# Altium footprint library GND_Studio.PcbLib: 16 footprints
Each footprint in its own frame and in the unit in brackets; x right, y up, seen from the top. Pads: shape width x height; smd on the part's side, far side on the other; paste and mask are expansions set on the pad; w line width, h text height; cw(c..) or ccw(c..) is an arc to the next point about the centre after c.
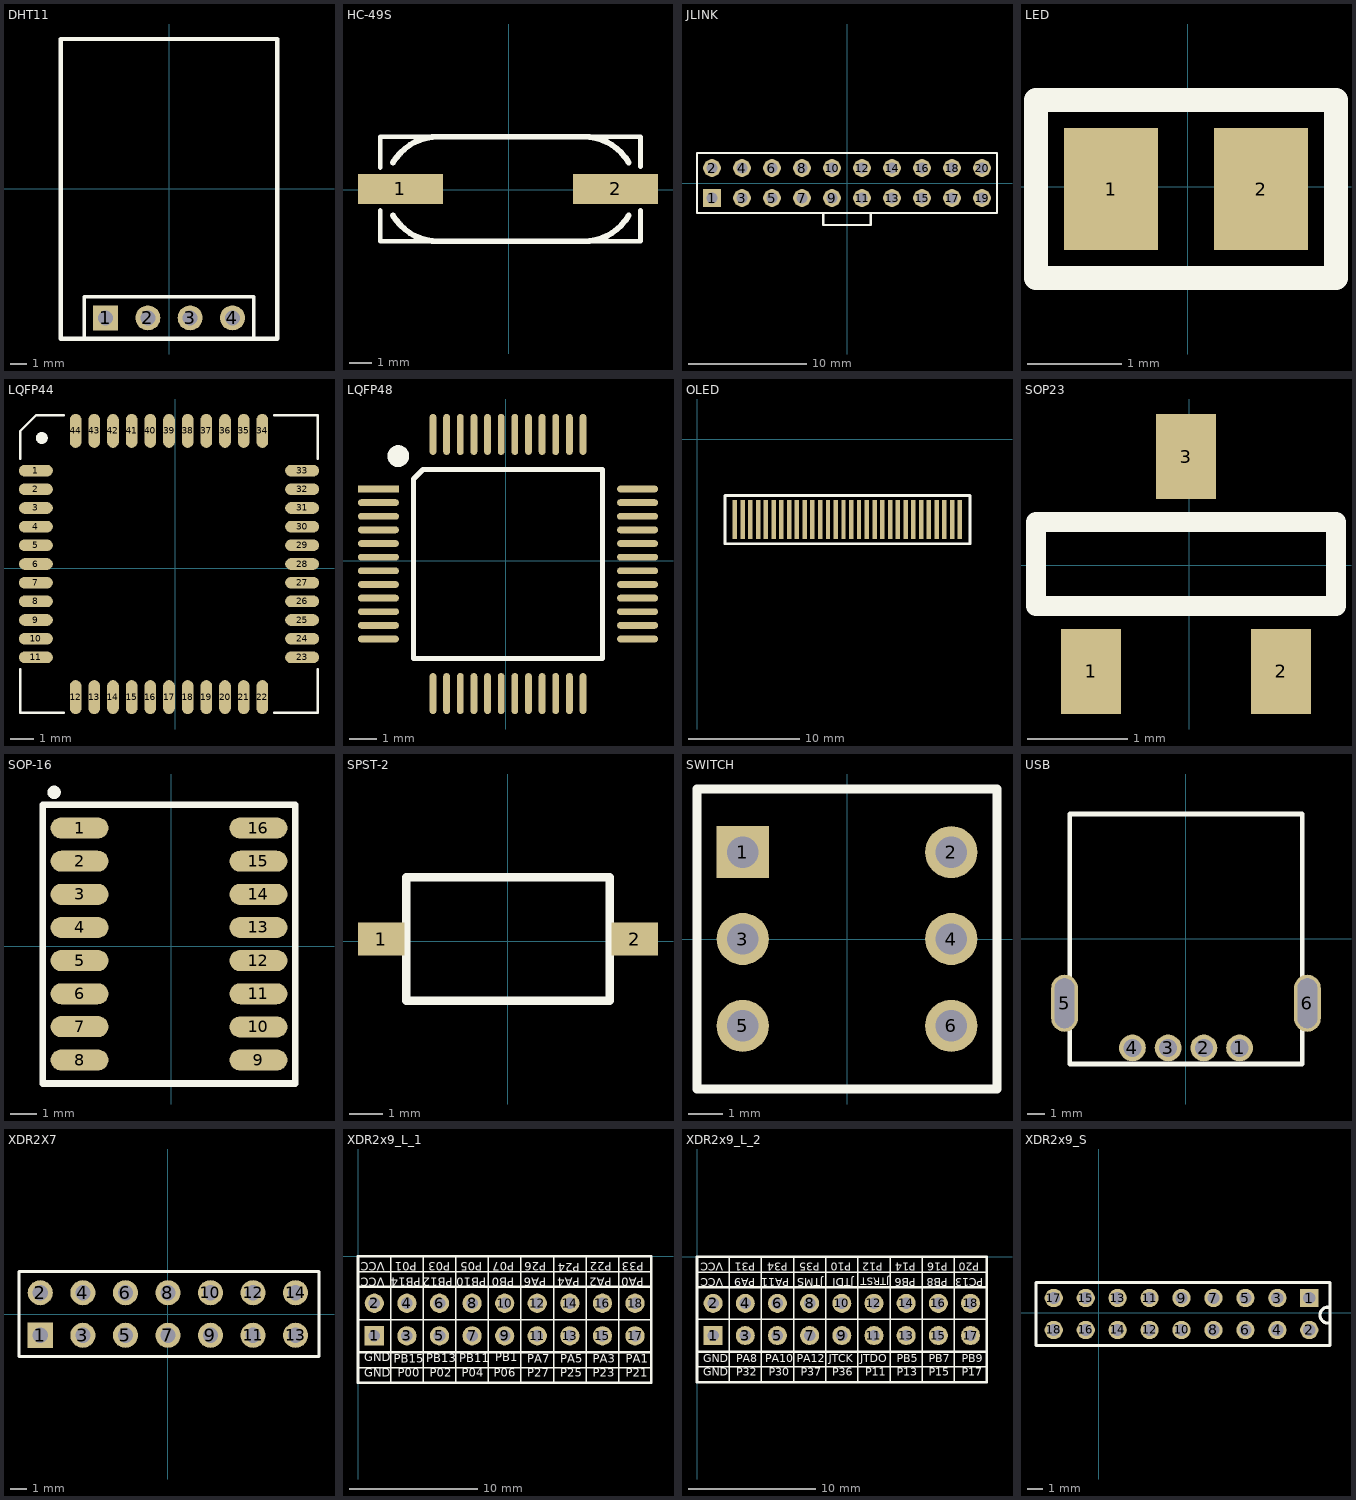
[diagram p0: the footprints below, top view; thin cyan lines are the x and y axes]

## DHT11 [mm]
pads (4):
  rect 1.5x1.5 hole 0.9: 1(-3.81,-7.747)
  round 1.5 hole 0.9: 2(-1.27,-7.747) 3(1.27,-7.747) 4(3.81,-7.747)
Top Overlay:
  lines w0.2: -5.08,-9.017 5.08,-9.017 5.08,-6.477 -5.08,-6.477 -5.08,-9.017
  lines w0.254: -6.5,-9 6.5,-9 6.5,9 -6.5,9 -6.5,-9

## HC-49S [mil]
pads (2):
  rect 146x51 smd: 1(-186.46,1.54) 2(183.54,1.54)
Top Overlay:
  lines w8: -221.46,-88.46 226.54,-88.46 ; -221.46,-87.46 -221.46,-35.46 ; -221.46,38.54 -221.46,90.54 ; -221.46,91.54 226.54,91.54 ; 226.54,-87.46 226.54,-35.46 ; 226.54,39.54 226.54,90.54
  lines w10: -199.03,-44.1 ccw(c-121.46,1.54) -121.46,-88.46 128.54,-88.46 ccw(c128.54,1.54) 206.12,-44.1 ; -199.03,47.17 cw(c-121.46,1.54) -121.46,91.54 ; -131.46,91.54 128.54,91.54 cw(c128.54,1.54) 206.12,47.17
3D body "User Library-HC-49S.STEP": height 169.29, standoff -1.97, extent -240.86,-91.13 243.39,93.9

## JLINK [mm]
pads (20):
  rect 1.5x1.5 hole 0.9: 1(-11.43,-1.27)
  round 1.5 hole 0.9: 2(-11.43,1.27) 3(-8.89,-1.27) 4(-8.89,1.27) 5(-6.35,-1.27) 6(-6.35,1.27) 7(-3.81,-1.27) 8(-3.81,1.27) 9(-1.27,-1.27) 10(-1.27,1.27) 11(1.27,-1.27) 12(1.27,1.27) 13(3.81,-1.27) 14(3.81,1.27) 15(6.35,-1.27) 16(6.35,1.27) 17(8.89,-1.27) 18(8.89,1.27) 19(11.43,-1.27) 20(11.43,1.27)
Top Overlay:
  lines w0.2: -2,-2.54 -2,-3.556 2,-3.556 2,-2.54 ; -12.7,-2.54 -12.7,2.54 -10.795,2.54 12.7,2.54 12.7,-2.54 -10.795,-2.54 -12.7,-2.54

## LED [mm]
pads (2):
  rect 1x1.3 smd: 1(-0.821,-0.022) 2(0.779,-0.022)
Top Overlay:
  lines w0.254: -1.621,-0.972 -1.621,0.928 ; -1.621,-0.972 1.579,-0.972 1.579,0.928 -1.621,0.928
3D body "alsrobot-LED0805(Y).STEP": height 1.1, standoff 0, extent -1.031,-0.647 0.989,0.603

## LQFP44 [mm]
pads (44):
  oval 1.45x0.5 smd: 1(-5.969,4.191) 2(-5.969,3.391) 3(-5.969,2.591) 4(-5.969,1.791) 5(-5.969,0.991) 6(-5.969,0.191) 7(-5.969,-0.609) 8(-5.969,-1.409) 9(-5.969,-2.209) 10(-5.969,-3.009) 11(-5.969,-3.809) 23(5.431,-3.809) 24(5.431,-3.009) 25(5.431,-2.209) 26(5.431,-1.409) 27(5.431,-0.609) 28(5.431,0.191) 29(5.431,0.991) 30(5.431,1.791) 31(5.431,2.591) 32(5.431,3.391) 33(5.431,4.191)
  oval 0.5x1.45 smd: 12(-4.269,-5.509) 13(-3.469,-5.509) 14(-2.669,-5.509) 15(-1.869,-5.509) 16(-1.069,-5.509) 17(-0.269,-5.509) 18(0.531,-5.509) 19(1.331,-5.509) 20(2.131,-5.509) 21(2.931,-5.509) 22(3.731,-5.509) 34(3.731,5.891) 35(2.931,5.891) 36(2.131,5.891) 37(1.331,5.891) 38(0.531,5.891) 39(-0.269,5.891) 40(-1.069,5.891) 41(-1.869,5.891) 42(-2.669,5.891) 43(-3.469,5.891) 44(-4.269,5.891)
Top Overlay:
  circle w0.254: c-5.715,5.588 r0.127
  lines w0.1: -6.644,-4.309 -6.644,-6.184 -4.769,-6.184 ; -6.644,4.691 -6.644,5.891 -5.969,6.566 -4.769,6.566 ; 4.231,-6.184 6.106,-6.184 6.106,-4.309 ; 4.231,6.566 6.106,6.566 6.106,4.691

## LQFP48 [mm]
pads (48):
  rect 1.5x0.25 smd: 1(-4.67,2.637)
  oval 1.5x0.25 smd: 2(-4.67,2.137) 3(-4.67,1.637) 4(-4.67,1.137) 5(-4.67,0.637) 6(-4.67,0.137) 7(-4.67,-0.363) 8(-4.67,-0.863) 9(-4.67,-1.363) 10(-4.67,-1.863) 11(-4.67,-2.363) 12(-4.67,-2.863) 25(4.83,-2.863) 26(4.83,-2.363) 27(4.83,-1.863) 28(4.83,-1.363) 29(4.83,-0.863) 30(4.83,-0.363) 31(4.83,0.137) 32(4.83,0.637) 33(4.83,1.137) 34(4.83,1.637) 35(4.83,2.137) 36(4.83,2.637)
  oval 0.25x1.5 smd: 13(-2.67,-4.863) 14(-2.17,-4.863) 15(-1.67,-4.863) 16(-1.17,-4.863) 17(-0.67,-4.863) 18(-0.17,-4.863) 19(0.33,-4.863) 20(0.83,-4.863) 21(1.33,-4.863) 22(1.83,-4.863) 23(2.33,-4.863) 24(2.83,-4.863) 37(2.83,4.637) 38(2.33,4.637) 39(1.83,4.637) 40(1.33,4.637) 41(0.83,4.637) 42(0.33,4.637) 43(-0.17,4.637) 44(-0.67,4.637) 45(-1.17,4.637) 46(-1.67,4.637) 47(-2.17,4.637) 48(-2.67,4.637)
Top Overlay:
  circle w0.4: c-3.944,3.843 r0.2
  lines w0.2: -3.385,-3.578 -3.385,3.002 -3.035,3.352 3.545,3.352 3.545,-3.578 -3.385,-3.578
3D body "SW3dPS-Quad50M48.STEP": height 1.56, standoff 0, extent -4.446,-4.593 4.554,4.407

## OLED [mm]
pads (30):
  rect 0.4x3.5 smd: 1(3.39,-7.219) 2(4.09,-7.219) 3(4.79,-7.219) 4(5.49,-7.219) 5(6.19,-7.219) 6(6.89,-7.219) 7(7.59,-7.219) 8(8.29,-7.219) 9(8.99,-7.219) 10(9.69,-7.219) 11(10.39,-7.219) 12(11.09,-7.219) 13(11.79,-7.219) 14(12.49,-7.219) 15(13.19,-7.219) 16(13.89,-7.219) 17(14.59,-7.219) 18(15.29,-7.219) 19(15.99,-7.219) 20(16.69,-7.219) 21(17.39,-7.219) 22(18.09,-7.219) 23(18.79,-7.219) 24(19.49,-7.219) 25(20.19,-7.219) 26(20.89,-7.219) 27(21.59,-7.219) 28(22.29,-7.219) 29(22.99,-7.219) 30(23.69,-7.219)
Top Overlay:
  lines w0.254: 2.501,-9.403 24.599,-9.403 24.599,-5.06 2.501,-5.06 2.501,-9.403
Bottom Overlay:
  lines w0.254: -0.019,-22.487 -0.019,0.033 27.031,0.033 27.031,-22.487 -0.019,-22.487
3D body "User Library-096OLED.STEP": height 0.22, standoff -3.62, extent 0.151,-22.335 26.851,-0.119

## SOP23 [mm]
pads (3):
  rect 0.6x0.85 smd: 1(-0.981,-1.064) 2(0.919,-1.064) 3(-0.031,1.086)
Top Overlay:
  lines w0.2: -1.531,-0.409 1.469,-0.409 1.469,0.433 -1.531,0.433 -1.531,-0.409
3D body "SW3DPS-SOT-23-DEFAULT.STEP": height 1.1, standoff 0, extent -1.536,-1.207 1.464,1.293

## SOP-16 [mm]
pads (16):
  oval 2.2x0.8 smd: 1(-3.477,4.484) 2(-3.477,3.224) 3(-3.477,1.964) 4(-3.477,0.704) 5(-3.477,-0.556) 6(-3.477,-1.816) 7(-3.477,-3.066) 8(-3.477,-4.336) 9(3.323,-4.336) 10(3.323,-3.076) 11(3.323,-1.816) 12(3.323,-0.556) 13(3.323,0.704) 14(3.323,1.964) 15(3.323,3.224) 16(3.323,4.484)
Top Overlay:
  circle w0.254: c-4.445,5.842 r0.127
  lines w0.254: -4.877,-5.226 4.723,-5.226 4.723,5.374 -4.877,5.374 -4.877,-5.226
3D body "User Library-SOP16_208mil (5_3mm).STEP": height 2, standoff 0, extent -4.037,-5.026 3.884,5.174

## SPST-2 [mm]
pads (2):
  rect 1.4x1 smd: 1(-3.797,0.061) 2(3.803,0.061)
Top Overlay:
  lines w0.254: -3.047,-1.789 -3.047,1.911 3.053,1.911 3.053,-1.789 -3.047,-1.789
3D body "User Library-KEY_SOT_P2.STEP": height 2.49, standoff 0.1, extent -4.067,-1.739 4.073,1.861

## SWITCH [mm]
pads (6):
  rect 1.5x1.5 hole 0.9: 1(-3,2.5)
  round 1.5 hole 0.9: 2(3,2.5) 3(-3,0) 4(3,0) 5(-3,-2.5) 6(3,-2.5)
Top Overlay:
  lines w0.254: -4.318,-4.318 -4.318,4.318 4.318,4.318 4.318,-4.318 -4.318,-4.318

## USB [mm]
pads (6):
  round 1.5 hole 1: 1(3.023,-6.11) 2(1.023,-6.11) 3(-0.977,-6.11) 4(-2.977,-6.11)
  oval 1.5x3.2 hole 2.8 slot 1.1 at 0 deg: 5(-6.777,-3.61) 6(6.823,-3.61)
Top Overlay:
  lines w0.254: -6.477,-7.01 -6.477,6.99 6.523,6.99 6.523,-7.01 -6.477,-7.01

## XDR2X7 [mm]
pads (14):
  rect 1.5x1.5 hole 0.9: 1(-7.62,-1.27)
  round 1.5 hole 0.9: 2(-7.62,1.27) 3(-5.08,-1.27) 4(-5.08,1.27) 5(-2.54,-1.27) 6(-2.54,1.27) 7(0,-1.27) 8(0,1.27) 9(2.54,-1.27) 10(2.54,1.27) 11(5.08,-1.27) 12(5.08,1.27) 13(7.62,-1.27) 14(7.62,1.27)
Top Overlay:
  lines w0.2: -8.89,-2.54 -6.985,-2.54 9.017,-2.54 9.017,2.54 -6.985,2.54 -8.89,2.54 -8.89,-2.54

## XDR2x9_L_1 [mm]
pads (18):
  rect 1.5x1.5 hole 0.9: 1(1.267,-6.207)
  round 1.5 hole 0.9: 2(1.267,-3.667) 3(3.807,-6.207) 4(3.807,-3.667) 5(6.347,-6.207) 6(6.347,-3.667) 7(8.887,-6.207) 8(8.887,-3.667) 9(11.427,-6.207) 10(11.427,-3.667) 11(13.967,-6.207) 12(13.967,-3.667) 13(16.507,-6.207) 14(16.507,-3.667) 15(19.047,-6.207) 16(19.047,-3.667) 17(21.587,-6.207) 18(21.587,-3.667)
Top Overlay:
  lines w0.1: -0.003,-8.677 22.857,-8.677 ; -0.003,-4.937 22.857,-4.937 ; -0.003,-1.197 22.857,-1.197 ; 2.537,-9.877 2.537,0.003 ; 5.077,-9.877 5.077,0.016 ; 7.617,-9.877 7.617,0.003 ; 10.157,-9.877 10.157,0.003 ; 12.697,-9.877 12.697,0.003 ; 15.237,-9.877 15.237,0.003 ; 17.777,-9.877 17.777,0.003 ; 20.317,-9.877 20.317,0.003
  lines w0.2: -0.003,-7.477 22.857,-7.477 ; -0.003,-2.397 22.857,-2.397 ; -0.003,-9.877 -0.003,0.003 22.857,0.003 22.857,-9.877 -0.003,-9.877
  text "GND" at 0.477,-8.437 h1.1
  text "GND" at 0.477,-9.637 h1.1
  text "PB15" at 2.777,-8.537 h1.1
  text "PB13" at 5.331,-8.493 h1.1
  text "PB11" at 7.871,-8.493 h1.1
  text "PB1" at 10.677,-8.437 h1.1
  text "PA7" at 13.177,-8.537 h1.1
  text "PA5" at 15.777,-8.537 h1.1
  text "PA3" at 18.277,-8.537 h1.1
  text "PA1" at 20.877,-8.537 h1.1
  text "P00" at 3.077,-9.637 h1.1
  text "P02" at 5.577,-9.637 h1.1
  text "P04" at 8.077,-9.637 h1.1
  text "P06" at 10.577,-9.637 h1.1
  text "P27" at 13.177,-9.637 h1.1
  text "P25" at 15.777,-9.637 h1.1
  text "P23" at 18.277,-9.637 h1.1
  text "P21" at 20.877,-9.637 h1.1
  text "PA0" at 22.277,-1.437 h1.1
  text "PA2" at 19.777,-1.437 h1.1
  text "PA4" at 17.277,-1.437 h1.1
  text "PA6" at 14.677,-1.437 h1.1
  text "PB0" at 12.177,-1.437 h1.1
  text "PB10" at 9.977,-1.437 h1.1
  text "PB12" at 7.377,-1.437 h1.1
  text "PB14" at 4.877,-1.437 h1.1
  text "VCC" at 2.077,-1.437 h1.1
  text "VCC" at 2.077,-0.237 h1.1
  text "P01" at 4.577,-0.237 h1.1
  text "P03" at 7.177,-0.237 h1.1
  text "P05" at 9.677,-0.237 h1.1
  text "P07" at 12.177,-0.237 h1.1
  text "P26" at 14.677,-0.237 h1.1
  text "P24" at 17.277,-0.337 h1.1
  text "P22" at 19.777,-0.237 h1.1
  text "P33" at 22.277,-0.237 h1.1

## XDR2x9_L_2 [mm]
pads (18):
  rect 1.5x1.5 hole 0.9: 1(1.27,-6.223)
  round 1.5 hole 0.9: 2(1.27,-3.683) 3(3.81,-6.223) 4(3.81,-3.683) 5(6.35,-6.223) 6(6.35,-3.683) 7(8.89,-6.223) 8(8.89,-3.683) 9(11.43,-6.223) 10(11.43,-3.683) 11(13.97,-6.223) 12(13.97,-3.683) 13(16.51,-6.223) 14(16.51,-3.683) 15(19.05,-6.223) 16(19.05,-3.683) 17(21.59,-6.223) 18(21.59,-3.683)
Top Overlay:
  lines w0.1: 0,-8.693 22.86,-8.693 ; 0,-4.953 22.86,-4.953 ; 0,-1.213 22.86,-1.213 ; 2.54,-9.893 2.54,-0.013 ; 5.08,-9.893 5.08,0 ; 7.62,-9.893 7.62,-0.013 ; 10.16,-9.893 10.16,-0.013 ; 12.7,-9.893 12.7,-0.013 ; 15.24,-9.893 15.24,-0.013 ; 17.78,-9.893 17.78,-0.013 ; 20.32,-9.893 20.32,-0.013
  lines w0.2: 0,-7.493 22.86,-7.493 ; 0,-2.413 22.86,-2.413 ; 0,-9.893 0,-0.013 22.86,-0.013 22.86,-9.893 0,-9.893
  text "GND" at 0.48,-8.553 h1.1
  text "GND" at 0.48,-9.653 h1.1
  text "PA8" at 3.08,-8.553 h1.1
  text "PA10" at 5.38,-8.553 h1.1
  text "PA12" at 7.88,-8.553 h1.1
  text "JTCK" at 10.38,-8.553 h1.1
  text "JTDO" at 12.88,-8.553 h1.1
  text "PB5" at 15.78,-8.553 h1.1
  text "PB7" at 18.28,-8.553 h1.1
  text "PB9" at 20.88,-8.553 h1.1
  text "P32" at 3.08,-9.653 h1.1
  text "P30" at 5.68,-9.653 h1.1
  text "P37" at 8.18,-9.653 h1.1
  text "P36" at 10.68,-9.653 h1.1
  text "P11" at 13.28,-9.653 h1.1
  text "P13" at 15.78,-9.653 h1.1
  text "P15" at 18.28,-9.653 h1.1
  text "P17" at 20.88,-9.653 h1.1
  text "PC13" at 22.58,-1.453 h1.1
  text "PB8" at 19.78,-1.453 h1.1
  text "PB6" at 17.28,-1.453 h1.1
  text "JTRST" at 15.18,-1.453 h1
  text "JTDI" at 12.38,-1.453 h1.1
  text "JTMS" at 9.98,-1.453 h1.1
  text "PA11" at 7.28,-1.453 h1.1
  text "PA9" at 4.58,-1.453 h1.1
  text "VCC" at 2.08,-1.453 h1.1
  text "VCC" at 2.08,-0.253 h1.1
  text "P31" at 4.58,-0.253 h1.1
  text "P34" at 7.18,-0.253 h1.1
  text "P35" at 9.68,-0.253 h1.1
  text "P10" at 12.18,-0.253 h1.1
  text "P12" at 14.68,-0.253 h1.1
  text "P14" at 17.28,-0.253 h1.1
  text "P16" at 19.78,-0.253 h1.1
  text "P20" at 22.28,-0.253 h1.1

## XDR2x9_S [mil]
pads (18):
  rect 45x45 hole 30: 1(518.74,36.85)
  round 45 hole 30: 2(518.74,-41.89) 3(440,36.85) 4(440,-41.89) 5(361.26,36.85) 6(361.26,-41.89) 7(282.52,36.85) 8(282.52,-41.89) 9(203.78,36.85) 10(203.78,-41.89) 11(125.04,36.85) 12(125.04,-41.89) 13(46.3,36.85) 14(46.3,-41.89) 15(-32.44,36.85) 16(-32.44,-41.89) 17(-111.18,36.85) 18(-111.18,-41.89)
Top Overlay:
  lines w7.87: 565,-25 cw(c565,-5.32) 565,14.37 ; -155,-80 570,-80 570,75 -155,75 -155,-80